# Altium footprint library aiskylab-01Resistors.PcbLib: 208 footprints (part 1 of 13)
Each footprint in its own frame and in the unit in brackets; x right, y up, seen from the top. Pads: shape width x height; smd on the part's side, far side on the other; paste and mask are expansions set on the pad; w line width, h text height; cw(c..) or ccw(c..) is an arc to the next point about the centre after c.
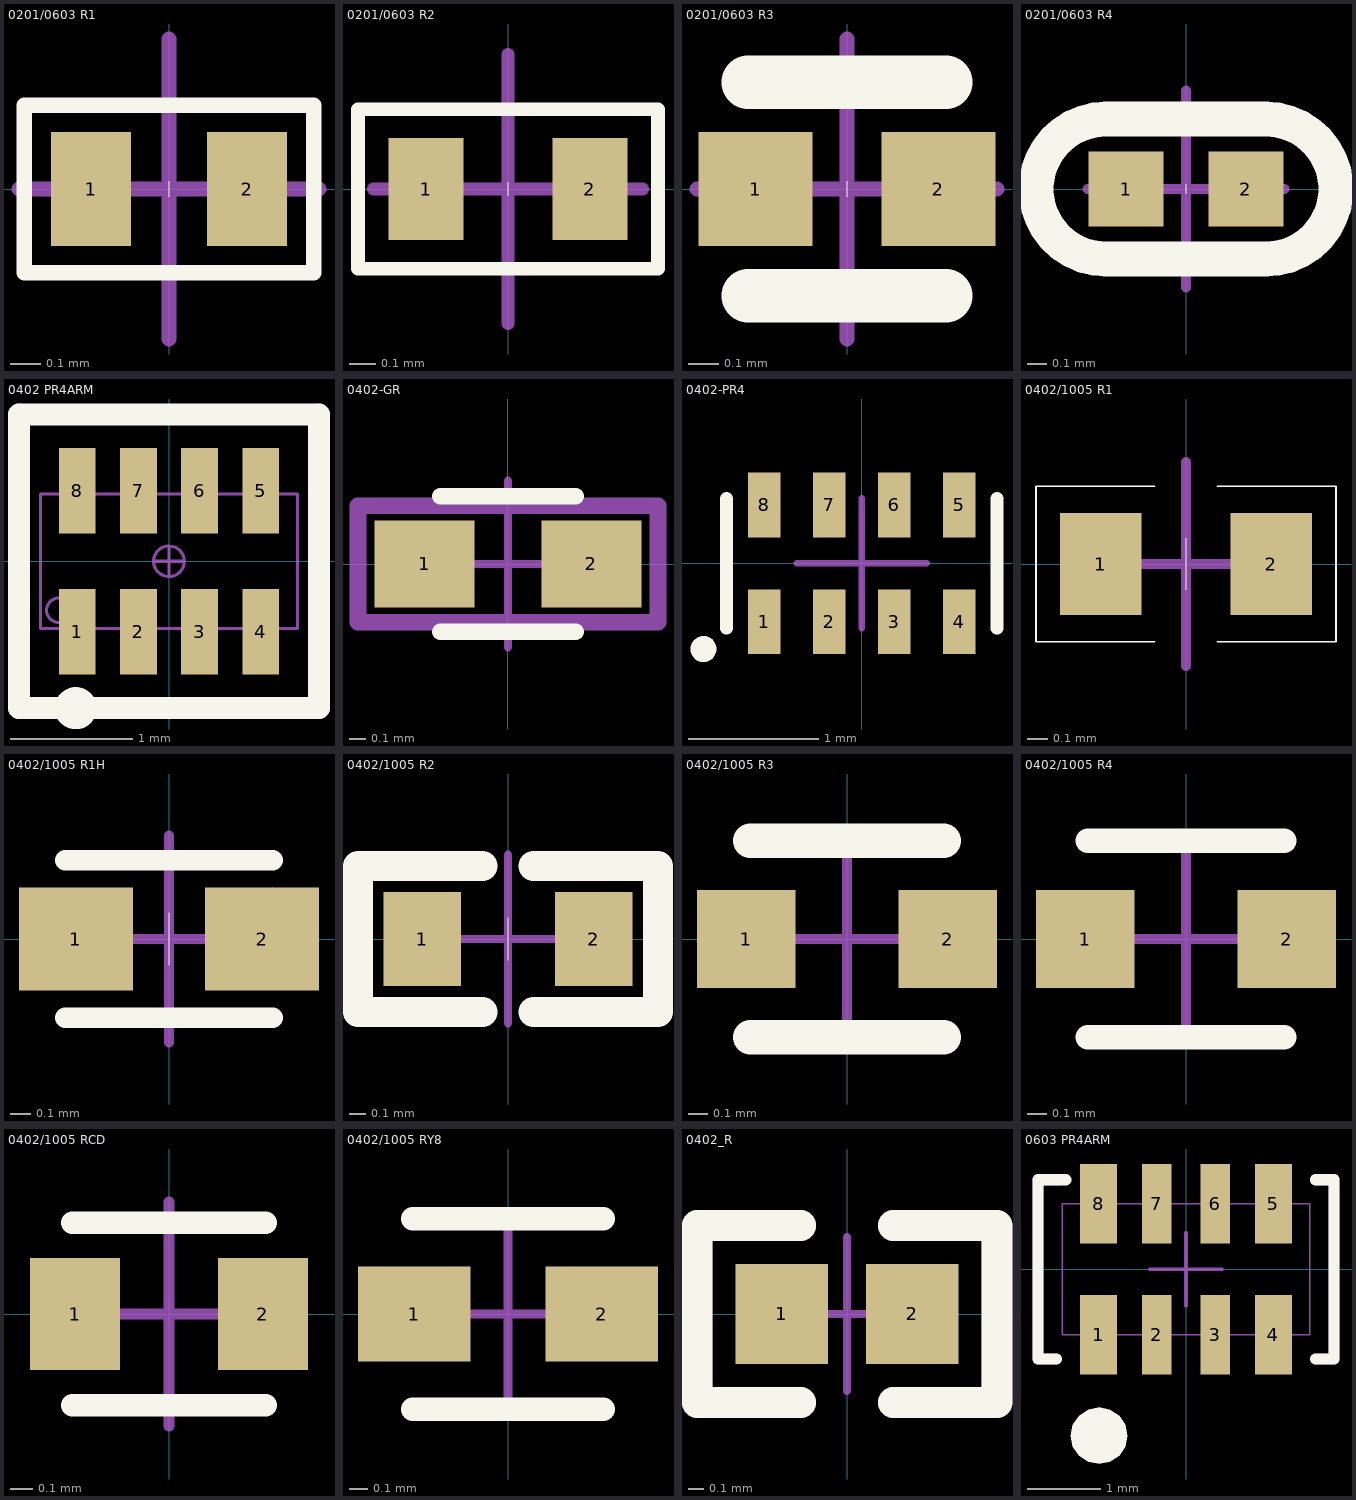
[diagram p0: the footprints below, top view; thin cyan lines are the x and y axes]

## 0201/0603 R1 [mil]
height 649.61
pads (2):
  rect 10.5x15 smd mask+2: 1(-10.24,0) 2(10.24,0)
Top Overlay:
  lines w0.1: 0,-1 0,1 ; 0,-1 0,1 ; 0,-1 0,1
  lines w2: -19,-11 19,-11 19,11 -19,11 -19,-11
Top Designator:
  text ".Designator" at -299.9,-19.99 h60
Top Component Center:
  lines w1.97: -19.68,0 19.68,0 ; 0,-19.68 0,19.68
3D body "0_381-0_267-0201.stp": height 0.79, standoff 0, extent -15.5,-7.5 -4.99,7.5
3D body "0_381-0_267-0201.stp": height 0.79, standoff 0, extent 4.99,-7.51 15.5,7.5
3D body "0201_smt-r.stp": height 9.09, standoff 0, extent -11.81,-6 11.81,5.89

## 0201/0603 R2 [mil]
height 649.61
pads (2):
  rect 11x15 smd mask+2: 1(-12,0) 2(12,0)
Top Overlay:
  lines w0.1: 0,-1 0,1
  lines w2: -22,-11.7 22,-11.7 22,11.7 -22,11.7 -22,-11.7
Top Designator:
  text ".Designator" at -299.9,-19.99 h60
Top Component Center:
  lines w1.97: -19.68,0 19.68,0 ; 0,-19.68 0,19.68
3D body "0_381-0_267-0201.stp": height 0.79, standoff 0, extent 6.99,-7.51 17.5,7.5
3D body "0_381-0_267-0201.stp": height 0.79, standoff 0, extent -17.5,-7.5 -6.99,7.5
3D body "0201-r.stp": height 9.09, standoff 0, extent -12,-6 11.63,5.81

## 0201/0603 R3 [mil]
height 649.61
pads (2):
  rect 15x15 smd mask+2: 1(-12,0)
  rect 15x15 smd mask+2.76: 2(12,0)
Top Overlay:
  lines w0.1: 0,-1 0,1
  lines w7: -13,-14 13,-14 ; -13,14 13,14
Top Designator:
  text ".Designator" at -299.52,-19.99 h60
Top Component Center:
  lines w1.97: -19.68,0 19.68,0 ; 0,-19.68 0,19.68
3D body "0_381-0_381-0201a.stp": height 0.79, standoff 0, extent -19.5,-7.5 -4.5,7.5
3D body "0_381-0_381-0201a.stp": height 0.79, standoff 0, extent 4.5,-7.51 19.5,7.49
3D body "0201-r.stp": height 9.09, standoff 0, extent -12,-6 11.63,5.81

## 0201/0603 R4 [mil]
height 649.61
pads (2):
  rect 15x15 smd mask+2.76: 1(-12,0)
  rect 15x15 smd mask+2: 2(12,0)
Top Overlay:
  lines w0.1: 0,-1 0,1
  lines w7: -16,-14 16,-14 ; -16,14 16,14
  lines w7.01: -16,-14.03 cw(c-16,-0.02) -16,14 ; 16,-14.03 ccw(c16,-0.02) 16,14
Top Designator:
  text ".Designator" at -299.9,-19.99 h60
Top Component Center:
  lines w1.97: -19.68,0 19.68,0 ; 0,-19.68 0,19.68
3D body "0_381-0_381-0201a.stp": height 0.79, standoff 0, extent -19.5,-7.5 -4.5,7.5
3D body "0_381-0_381-0201a.stp": height 0.79, standoff 0, extent 4.5,-7.5 19.5,7.5
3D body "0201-r.stp": height 9.09, standoff 0, extent -12,-6 11.63,5.81

## 0402 PR4ARM [mm]
height 16.5
pads (8):
  rect 0.3x0.7 smd: 1(-0.75,-0.575) 2(-0.25,-0.575) 3(0.25,-0.575) 4(0.75,-0.575) 5(0.75,0.575) 6(0.25,0.575) 7(-0.25,0.575) 8(-0.75,0.575)
Top Overlay:
  circle w0.254: c-0.762,-1.2 r0.045
  lines w0.18: -1.225,-1.2 1.225,-1.2 1.225,1.2 -1.225,1.2 -1.225,-1.2
Top Designator:
  text ".Designator" at -7.618,-0.549 h1.52
Top Assembly:
  circle w0.025: c-0.9,-0.4 r0.1
  lines w0.025: -1.05,-0.55 1.05,-0.55 1.05,0.55 -1.05,0.55 -1.05,-0.55
Top Component Center:
  circle w0.025: c0,0 r0.125
  lines w0.025: -0.125,0 0.125,0 ; 0,-0.125 0,0.125
  lines w0.18: -1.225,-1.2 -1.225,1.2 ; 1.225,-1.2 1.225,1.2
Fab Notes:
  text "1" at -0.75,-0.775 h0.5
  text "2" at -0.25,-0.775 h0.5
  text "6" at 0.25,0.375 h0.5
  text "8" at -0.75,0.375 h0.5
  text "5" at 0.75,0.375 h0.5
  text "7" at -0.25,0.375 h0.5
  text "4" at 0.75,-0.775 h0.5
  text "3" at 0.25,-0.775 h0.5
3D body "0402-armpr.stp": height 0, standoff 0, extent -0.9,0.225 -0.6,0.925
3D body "0402-armpr.stp": height 0, standoff 0, extent -0.4,0.225 -0.1,0.925
3D body "0402-armpr.stp": height 0, standoff 0, extent 0.1,0.225 0.4,0.925
3D body "0402-armpr.stp": height 0, standoff 0, extent 0.6,0.225 0.9,0.925
3D body "0402-armpr.stp": height 0, standoff 0, extent -0.9,-0.925 -0.6,-0.225
3D body "0402-armpr.stp": height 0, standoff 0, extent -0.4,-0.925 -0.1,-0.225
3D body "0402-armpr.stp": height 0, standoff 0, extent 0.1,-0.925 0.4,-0.225
3D body "0402-armpr.stp": height 0, standoff 0, extent 0.6,-0.925 0.9,-0.225
3D body "0402-pr4.stp": height 0.22, standoff 0, extent -0.925,-0.51 0.925,0.51

## 0402-GR [mm] "桔灯"
height 16.5
pads (2):
  rect 0.6x0.52 smd: 1(-0.5,0) 2(0.5,0)
Top Overlay:
  lines w0.1: -0.406,-0.406 0.406,-0.406 ; -0.406,0.406 0.406,0.406
Top Designator:
  text ".Designator" at -7.618,-0.508 h1.52
Top Assembly:
  lines w0.1: -0.9,-0.35 0.9,-0.35 0.9,0.35 -0.9,0.35 -0.9,-0.35
Top Component Center:
  lines w0.05: -0.5,0 0.5,0 ; 0,-0.5 0,0.5
3D body "0_52-0_6.stp": height 0.01, standoff 0, extent 0.2,-0.26 0.8,0.26
3D body "0_52-0_6.stp": height 0.01, standoff 0, extent -0.8,-0.26 -0.2,0.26
3D body "0402-r.stp": height 0.31, standoff 0, extent -0.5,-0.25 0.5,0.25

## 0402-PR4 [mm]
height 16.5
pads (8):
  rect 0.25x0.5 smd: 1(-0.75,-0.45) 2(-0.25,-0.45) 3(0.25,-0.45) 4(0.75,-0.45) 5(0.75,0.45) 6(0.25,0.45) 7(-0.25,0.45) 8(-0.75,0.45)
Top Overlay:
  circle w0.1: c-1.219,-0.66 r0.05
  lines w0.1: -1.041,-0.5 -1.041,0.5 ; 1.041,-0.5 1.041,0.5
Top Designator:
  text ".Designator" at -7.731,-0.508 h1.52
Top Component Center:
  lines w0.05: -0.5,0 0.5,0 ; 0,-0.5 0,0.5
3D body "0402-pr4.stp": height 0.22, standoff 0, extent -0.925,-0.51 0.925,0.51
3D body "0_25-0_5.stp": height 0.01, standoff 0, extent 0.625,0.2 0.875,0.7
3D body "0_25-0_5.stp": height 0.01, standoff 0, extent 0.125,0.2 0.375,0.7
3D body "0_25-0_5.stp": height 0.01, standoff 0, extent -0.375,0.2 -0.125,0.7
3D body "0_25-0_5.stp": height 0.01, standoff 0, extent -0.875,0.2 -0.625,0.7
3D body "0_25-0_5.stp": height 0.01, standoff 0, extent -0.875,-0.7 -0.625,-0.2
3D body "0_25-0_5.stp": height 0.01, standoff 0, extent -0.375,-0.7 -0.125,-0.2
3D body "0_25-0_5.stp": height 0.01, standoff 0, extent 0.125,-0.7 0.375,-0.2
3D body "0_25-0_5.stp": height 0.01, standoff 0, extent 0.625,-0.7 0.875,-0.2

## 0402/1005 R1 [mm]
height 16.5
pads (2):
  rect 0.4x0.5 smd mask+0.051: 1(-0.419,0)
  rect 0.4x0.5 smd mask+0.07: 2(0.419,0)
Top Overlay:
  lines w0.003: 0,-0.127 0,0.127
  lines w0.008: -0.152,-0.381 -0.737,-0.381 -0.737,0.381 -0.152,0.381 ; 0.152,-0.381 0.737,-0.381 0.737,0.381 0.152,0.381
Top Designator:
  text ".Designator" at -7.618,-0.508 h1.52
Top Component Center:
  lines w0.05: -0.5,0 0.5,0 ; 0,-0.5 0,0.5
3D body "0_4-0_5-0402.stp": height 0.02, standoff 0, extent 0.222,-0.246 0.622,0.254
3D body "0_4-0_5-0402.stp": height 0.02, standoff 0, extent -0.619,-0.25 -0.219,0.25
3D body "0402-r.stp": height 0.31, standoff 0, extent -0.5,-0.254 0.5,0.246

## 0402/1005 R1H [mm]
height 16.5
pads (2):
  rect 0.55x0.5 smd mask+0.07: 1(-0.45,0)
  rect 0.55x0.5 smd mask+0.051: 2(0.45,0)
Top Overlay:
  lines w0.001: 0.499,0.25 0.499,0.25
  lines w0.003: 0,-0.127 0,0.127
  lines w0.1: -0.5,-0.381 0.5,-0.381 ; -0.5,0.381 0.5,0.381
Top Designator:
  text ".Designator" at -7.627,-0.508 h1.52
Top Component Center:
  lines w0.05: -0.5,0 0.5,0 ; 0,-0.5 0,0.5
3D body "0_4-0_5-0402.stp": height 0.02, standoff 0, extent 0.333,-0.25 0.733,0.25
3D body "0_4-0_5-0402.stp": height 0.02, standoff 0, extent -0.733,-0.25 -0.333,0.25
3D body "0402-r.stp": height 0.31, standoff 0, extent -0.5,-0.254 0.5,0.246

## 0402/1005 R2 [mil]
height 649.61
pads (2):
  rect 18x22 smd mask+2: 1(-20,0)
  rect 18x22 smd mask+2.76: 2(20,0)
Top Overlay:
  lines w0.1: 0,-5 0,5
  lines w7: -6,-17 -35,-17 -35,17 -6,17 ; 6,-17 35,-17 35,17 6,17
Top Designator:
  text ".Designator" at -299.9,-19.99 h60
Top Component Center:
  lines w1.97: -19.68,0 19.68,0 ; 0,-19.68 0,19.68
3D body "0_4-0_5-0402.stp": height 0.79, standoff 0, extent -29.25,-9.69 -13.5,9.99
3D body "0_4-0_5-0402.stp": height 0.79, standoff 0, extent 13.25,-9.69 29,9.99
3D body "0402-r.stp": height 12.01, standoff 0, extent -19.68,-10 19.69,9.69

## 0402/1005 R3 [mil]
height 649.61
pads (2):
  rect 20x20 smd: 1(-20.5,0)
  rect 20x20 smd mask+2.76: 2(20.5,0)
Top Overlay:
  lines w7: -19.68,-20 19.68,-20 ; -19.68,20 19.68,20
Top Designator:
  text ".Designator" at -300.52,-19.99 h60
Top Component Center:
  lines w1.97: -19.68,0 19.68,0 ; 0,-19.68 0,19.68
3D body "0_508-0_508-0402-3.stp": height 0.79, standoff 0, extent -30.5,-10 -10.5,10
3D body "0_508-0_508-0402-3.stp": height 0.79, standoff 0, extent 10.5,-10.01 30.5,9.99
3D body "0402-r.stp": height 12.01, standoff 0, extent -19.68,-10 19.69,9.69

## 0402/1005 R4 [mil]
height 649.61
pads (2):
  rect 20x20 smd mask+2.76: 1(-20.5,0) 2(20.5,0)
Top Overlay:
  lines w5: -20,-20 20,-20 ; -20,20 20,20
Top Designator:
  text ".Designator" at -299.9,-19.99 h60
Top Component Center:
  lines w1.97: -19.68,0 19.68,0 ; 0,-19.68 0,19.68
3D body "0_508-0_508-0402-3.stp": height 0.79, standoff 0, extent 10.5,-10 30.5,10
3D body "0_508-0_508-0402-3.stp": height 0.79, standoff 0, extent -30.5,-10 -10.5,10
3D body "0402-r.stp": height 12.01, standoff 0, extent -19.68,-10 19.69,9.69

## 0402/1005 RCD [mm]
height 16.5
pads (2):
  rect 0.4x0.5 smd mask+0.051: 1(-0.419,0) 2(0.419,0)
Top Overlay:
  lines w0.1: -0.432,-0.406 0.432,-0.406 ; -0.432,0.406 0.432,0.406
Top Designator:
  text ".Designator" at -7.618,-0.508 h1.52
Top Component Center:
  lines w0.05: -0.5,0 0.5,0 ; 0,-0.5 0,0.5
Top 3D Body:
  lines w0.02: -0.127,0 0.127,0
3D body "0_4-0_5-0402.stp": height 0.02, standoff 0, extent -0.622,-0.246 -0.222,0.254
3D body "0_4-0_5-0402.stp": height 0.02, standoff 0, extent 0.222,-0.246 0.622,0.254
3D body "0402-r.stp": height 0.31, standoff 0, extent -0.5,-0.254 0.5,0.246

## 0402/1005 RY8 [mm]
height 16.5
pads (2):
  rect 0.6x0.508 smd mask+0.07: 1(-0.5,0) 2(0.5,0)
Top Overlay:
  lines w0.127: -0.508,-0.508 0.508,-0.508 ; -0.508,0.508 0.508,0.508
Top Designator:
  text ".Designator" at -7.618,-0.508 h1.52
Top Component Center:
  lines w0.05: -0.5,0 0.5,0 ; 0,-0.5 0,0.5
3D body "0_508-0_508-0402-3.stp": height 0.02, standoff 0, extent 0.28,-0.254 0.788,0.254
3D body "0_508-0_508-0402-3.stp": height 0.02, standoff 0, extent -0.787,-0.254 -0.279,0.254
3D body "0402-r.stp": height 0.31, standoff 0, extent -0.5,-0.254 0.5,0.246

## 0402_R [mm]
pads (2):
  rect 0.6x0.65 smd mask+0.051: 1(-0.425,0) 2(0.425,0)
Top Overlay:
  lines w0.2: -0.3,-0.575 -0.975,-0.575 -0.975,0.575 -0.3,0.575 ; 0.3,-0.575 0.975,-0.575 0.975,0.575 0.3,0.575
Top Designator:
  text ".Designator" at -7.618,-0.508 h1.52
Top Assembly:
  lines w0.2: -0.3,-0.575 -0.975,-0.575 -0.975,0.575 -0.3,0.575 ; 0.3,-0.575 0.975,-0.575 0.975,0.575 0.3,0.575
Top Component Center:
  lines w0.05: -0.5,0 0.5,0 ; 0,-0.5 0,0.5
Top Component Outline:
  lines w0.2: -0.3,-0.575 -0.975,-0.575 -0.975,0.575 -0.3,0.575 ; 0.3,-0.575 0.975,-0.575 0.975,0.575 0.3,0.575
3D body "User Library-RES_1005-0402.STEP": height 0.41, standoff 0, extent -0.575,-0.275 0.575,0.275

## 0603 PR4ARM [mil]
height 649.61
pads (8):
  rect 20x43 smd: 1(-47.24,-35.43) 4(47.24,-35.43) 5(47.24,35.43) 8(-47.24,35.43)
  rect 16x43 smd: 2(-15.75,-35.43) 3(15.75,-35.43) 6(15.75,35.43) 7(-15.75,35.43)
Top Overlay:
  pour cut-out: -31.71,-90 -32.87,-95.85 -36.19,-100.81 -41.15,-104.13 -47,-105.29 -52.85,-104.13 -57.81,-100.81 -61.13,-95.85 -62.29,-90 -61.13,-84.15 -57.81,-79.19 -52.85,-75.87 -47,-74.71 -41.15,-75.87 -36.19,-79.19 -32.87,-84.15
  lines w6: -70,-48.43 -79.93,-48.43 -79.93,48.43 -65,48.43 ; 70,-48.43 79.93,-48.43 79.93,48.43 70,48.43
Top Designator:
  text ".Designator" at -299.9,-41.63 h60
Top Assembly:
  lines w1: -66.93,-35.43 -66.93,35.43 66.93,35.43 66.93,-35.43 -66.93,-35.43
  lines w6: -70,-48.43 -79.93,-48.43 -79.93,48.43 -68.11,48.43 ; 70,-48.43 79.93,-48.43 79.93,48.43 70,48.43
Top Component Center:
  lines w1.97: -19.68,0 19.68,0 ; 0,-19.68 0,19.68
Fab Notes:
  text "4" at 37.24,-35.43 h25
  text "5" at 37.24,35.43 h25
  text "8" at -57.24,35.43 h25
  text "7" at -25.75,35.43 h25
  text "6" at 5.75,35.43 h25
  text "3" at 5.75,-35.43 h25
  text "2" at -25.75,-35.43 h25
  text "1" at -57.24,-35.43 h25
3D body "cay16-j2.stp": height 20.28, standoff 0, extent -62.99,-31.5 62.99,31.5
3D body "p109-051.stp": height 0.79, standoff 0, extent 37.2,13.98 57.28,56.89
3D body "p109-041.stp": height 0.79, standoff 0, extent 7.68,13.98 23.82,56.89
3D body "p109-041.stp": height 0.79, standoff 0, extent -23.82,13.98 -7.68,56.89
3D body "p109-051.stp": height 0.79, standoff 0, extent -57.28,13.98 -37.2,56.89
3D body "p109-051.stp": height 0.79, standoff 0, extent -57.28,-56.89 -37.2,-13.97
3D body "p109-041.stp": height 0.79, standoff 0, extent -23.82,-56.89 -7.68,-13.98
3D body "p109-041.stp": height 0.79, standoff 0, extent 7.68,-56.89 23.82,-13.97
3D body "p109-051.stp": height 0.79, standoff 0, extent 37.2,-56.89 57.28,-13.97